# Altium footprint library 6-Connectors-5.PcbLib: 46 footprints (part 4 of 5) (continued)
## TYCO_1-1734282-3 [mm] "Dual Stacked  Plug Over Receptacle Right Angled D-SUB 15 Pins Connector, With Threaded Insert UNC 4-40, And PCB Mount Retention"
height 31.98
pads (32):
  round 5.5 hole 3.2: 16(-16.65,-3.455) 17(16.65,-3.455)
  round 1.7 hole 1: L1(9.695,2.035) L2(6.925,2.035) L3(4.155,2.035) L4(1.385,2.035) L5(-1.385,2.035) L6(-4.155,2.035) L7(-6.925,2.035) L8(-9.695,2.035) L9(8.31,4.875) L10(5.54,4.875) L11(2.77,4.875) L12(0,4.875) L13(-2.77,4.875) L14(-5.54,4.875) L15(-8.31,4.875) U1(-9.695,-4.875) U2(-6.925,-4.875) U3(-4.155,-4.875) U4(-1.385,-4.875) U5(1.385,-4.875) U6(4.155,-4.875) U7(6.925,-4.875) U8(9.695,-4.875) U9(-8.31,-2.035) U10(-5.54,-2.035) U11(-2.77,-2.035) U12(0,-2.035) U13(2.77,-2.035) U14(5.54,-2.035) U15(8.31,-2.035)
Top Overlay:
  lines w0.2: -19.65,12.455 19.65,12.455 ; -19.6,-4.56 -19.6,-6.545 -13.8,-6.545 -13.8,-4.797 ; -19.6,-2.35 -19.6,10.455 ; -19.6,8.285 -13.6,8.285 ; -19.4,8.285 -19.4,7.085 -13.9,7.085 -13.9,8.285 13.9,8.285 13.9,7.085 19.4,7.085 19.4,8.285 ; -13.8,-2.113 -13.8,1.455 -13.6,1.88 ; -13.6,-4.242 -13.6,-6.695 13.6,-6.695 13.6,-4.242 ; -13.6,-2.668 -13.6,10.455 ; -13.087,12.955 -13.087,17.797 cw(c-12.187,17.797) -12.187,18.697 12.187,18.697 cw(c12.187,17.797) 13.087,17.797 13.087,12.955 ; 13.6,-2.668 13.6,10.455 ; 13.6,1.655 13.8,1.455 13.8,-2.113 ; 13.6,8.285 19.6,8.285 ; 13.8,-4.797 13.8,-6.545 19.6,-6.545 19.6,-4.56 ; 19.6,-2.35 19.6,10.451 ; -19.65,10.455 19.65,10.455 19.65,12.955 -19.65,12.955 -19.65,10.455
  text "LOWER" at -2.1,6.26 h1
  text "UPPER" at -2.1,-0.65 h1
  text "9" at 9.881,4.188 h1.5
  text "1" at 11.346,1.273 h1.5
  text "8" at -12.179,1.273 h1.5
  text "15" at -12.041,4.163 h1.5
  text "9" at -11.566,-2.797 h1.5
  text "1" at -11.779,-5.637 h1.5
  text "8" at 10.946,-5.637 h1.5
  text "15" at 9.881,-2.722 h1.5
Mechanical 8:
  lines w0.1: -19.65,12.955 19.65,12.955 ; -17.15,-3.455 -16.65,-3.455 ; -16.65,-3.955 -16.65,-3.455 ; -16.65,-2.955 -16.65,-3.455 ; -16.15,-3.455 -16.65,-3.455 ; -10.195,-4.875 -9.695,-4.875 ; -10.195,2.035 -9.695,2.035 ; -9.695,-5.375 -9.695,-4.875 ; -9.695,-4.375 -9.695,-4.875 ; -9.695,1.535 -9.695,2.035 ; -9.695,2.535 -9.695,2.035 ; -9.195,-4.875 -9.695,-4.875 ; -9.195,2.035 -9.695,2.035 ; -8.81,-2.035 -8.31,-2.035 ; -8.81,4.875 -8.31,4.875 ; -8.31,-2.535 -8.31,-2.035 ; -8.31,-1.535 -8.31,-2.035 ; -8.31,4.375 -8.31,4.875 ; -8.31,5.375 -8.31,4.875 ; -7.81,-2.035 -8.31,-2.035 ; -7.81,4.875 -8.31,4.875 ; -7.425,-4.875 -6.925,-4.875 ; -7.425,2.035 -6.925,2.035 ; -6.925,-5.375 -6.925,-4.875 ; -6.925,-4.375 -6.925,-4.875 ; -6.925,1.535 -6.925,2.035 ; -6.925,2.535 -6.925,2.035 ; -6.425,-4.875 -6.925,-4.875 ; -6.425,2.035 -6.925,2.035 ; -6.04,-2.035 -5.54,-2.035 ; -6.04,4.875 -5.54,4.875 ; -5.54,-2.535 -5.54,-2.035 ; -5.54,-1.535 -5.54,-2.035 ; -5.54,4.375 -5.54,4.875 ; -5.54,5.375 -5.54,4.875 ; -5.04,-2.035 -5.54,-2.035 ; -5.04,4.875 -5.54,4.875 ; -4.655,-4.875 -4.155,-4.875 ; -4.655,2.035 -4.155,2.035 ; -4.155,-5.375 -4.155,-4.875 ; -4.155,-4.375 -4.155,-4.875 ; -4.155,1.535 -4.155,2.035 ; -4.155,2.535 -4.155,2.035 ; -3.655,-4.875 -4.155,-4.875 ; -3.655,2.035 -4.155,2.035 ; -3.27,-2.035 -2.77,-2.035 ; -3.27,4.875 -2.77,4.875 ; -2.77,-2.535 -2.77,-2.035 ; -2.77,-1.535 -2.77,-2.035 ; -2.77,4.375 -2.77,4.875 ; -2.77,5.375 -2.77,4.875 ; -2.27,-2.035 -2.77,-2.035 ; -2.27,4.875 -2.77,4.875 ; -1.885,-4.875 -1.385,-4.875 ; -1.885,2.035 -1.385,2.035 ; -1.385,-5.375 -1.385,-4.875 ; -1.385,-4.375 -1.385,-4.875 ; -1.385,1.535 -1.385,2.035 ; -1.385,2.535 -1.385,2.035 ; -0.885,-4.875 -1.385,-4.875 ; -0.885,2.035 -1.385,2.035 ; -0.5,-2.035 0,-2.035 ; -0.5,0 0,0 ; -0.5,4.875 0,4.875 ; 0,-2.535 0,-2.035 ; 0,-1.535 0,-2.035 ; 0,-0.5 0,0 ; 0,0.5 0,0 ; 0,4.375 0,4.875 ; 0,5.375 0,4.875 ; 0.5,-2.035 0,-2.035 ; 0.5,0 0,0 ; 0.5,4.875 0,4.875 ; 0.885,-4.875 1.385,-4.875 ; 0.885,2.035 1.385,2.035 ; 1.385,-5.375 1.385,-4.875 ; 1.385,-4.375 1.385,-4.875 ; 1.385,1.535 1.385,2.035 ; 1.385,2.535 1.385,2.035 ; 1.885,-4.875 1.385,-4.875 ; 1.885,2.035 1.385,2.035 ; 2.27,-2.035 2.77,-2.035 ; 2.27,4.875 2.77,4.875 ; 2.77,-2.535 2.77,-2.035 ; 2.77,-1.535 2.77,-2.035 ; 2.77,4.375 2.77,4.875 ; 2.77,5.375 2.77,4.875 ; 3.27,-2.035 2.77,-2.035 ; 3.27,4.875 2.77,4.875 ; 3.655,-4.875 4.155,-4.875 ; 3.655,2.035 4.155,2.035 ; 4.155,-5.375 4.155,-4.875 ; 4.155,-4.375 4.155,-4.875 ; 4.155,1.535 4.155,2.035 ; 4.155,2.535 4.155,2.035 ; 4.655,-4.875 4.155,-4.875 ; 4.655,2.035 4.155,2.035 ; 5.04,-2.035 5.54,-2.035 ; 5.04,4.875 5.54,4.875 ; 5.54,-2.535 5.54,-2.035 ; 5.54,-1.535 5.54,-2.035 ; 5.54,4.375 5.54,4.875 ; 5.54,5.375 5.54,4.875 ; 6.04,-2.035 5.54,-2.035 ; 6.04,4.875 5.54,4.875 ; 6.425,-4.875 6.925,-4.875 ; 6.425,2.035 6.925,2.035 ; 6.925,-5.375 6.925,-4.875 ; 6.925,-4.375 6.925,-4.875 ; 6.925,1.535 6.925,2.035 ; 6.925,2.535 6.925,2.035 ; 7.425,-4.875 6.925,-4.875 ; 7.425,2.035 6.925,2.035 ; 7.81,-2.035 8.31,-2.035 ; 7.81,4.875 8.31,4.875 ; 8.31,-2.535 8.31,-2.035 ; 8.31,-1.535 8.31,-2.035 ; 8.31,4.375 8.31,4.875 ; 8.31,5.375 8.31,4.875 ; 8.81,-2.035 8.31,-2.035 ; 8.81,4.875 8.31,4.875 ; 9.195,-4.875 9.695,-4.875 ; 9.195,2.035 9.695,2.035 ; 9.695,-5.375 9.695,-4.875 ; 9.695,-4.375 9.695,-4.875 ; 9.695,1.535 9.695,2.035 ; 9.695,2.535 9.695,2.035 ; 10.195,-4.875 9.695,-4.875 ; 10.195,2.035 9.695,2.035 ; 16.15,-3.455 16.65,-3.455 ; 16.65,-3.955 16.65,-3.455 ; 16.65,-2.955 16.65,-3.455 ; 17.15,-3.455 16.65,-3.455
  text "PCB EDGE" at -3.725,11.475 h1
Mechanical 14:
  circle w0.1: c16.65,-3.455 r1.25
  circle w0.1: c-16.65,-3.455 r1.25
  lines w0.1: -19.65,12.455 19.65,12.455 ; -19.6,8.285 -13.6,8.285 ; -19.6,10.455 -19.6,-6.545 -13.8,-6.545 -13.8,1.455 -13.6,1.88 ; -19.4,8.285 -19.4,7.085 -13.9,7.085 -13.9,8.285 13.9,8.285 13.9,7.085 19.4,7.085 19.4,8.285 ; -17.76,-4.03 -17.3,-4.03 -17.3,-2.88 -17.76,-2.88 ; -17.225,-4.565 -17.225,-4.105 -16.075,-4.105 -16.075,-4.565 ; -17.225,-2.347 -17.225,-2.805 -16.075,-2.805 -16.075,-2.345 ; -15.542,-4.03 -16,-4.03 -16,-2.88 -15.54,-2.88 ; -13.6,10.455 -13.6,-6.695 13.6,-6.695 13.6,10.455 ; -13.087,12.955 -13.087,17.797 cw(c-12.187,17.797) -12.187,18.697 12.187,18.697 cw(c12.187,17.797) 13.087,17.797 13.087,12.955 ; 13.6,1.655 13.8,1.455 13.8,-6.545 19.6,-6.545 19.6,10.451 ; 13.6,8.285 19.6,8.285 ; 15.54,-4.03 16,-4.03 16,-2.88 15.54,-2.88 ; 16.075,-4.565 16.075,-4.105 17.225,-4.105 17.225,-4.565 ; 16.075,-2.347 16.075,-2.805 17.225,-2.805 17.225,-2.345 ; 17.758,-4.03 17.3,-4.03 17.3,-2.88 17.76,-2.88 ; -19.65,10.455 19.65,10.455 19.65,12.955 -19.65,12.955 -19.65,10.455
  text "15" at 9.881,-2.722 h1.5
  text "8" at 10.946,-5.637 h1.5
  text "1" at -11.779,-5.637 h1.5
  text "9" at -11.566,-2.797 h1.5
  text "15" at -12.041,4.163 h1.5
  text "8" at -12.179,1.273 h1.5
  text "1" at 11.346,1.273 h1.5
  text "9" at 9.881,4.188 h1.5
  text "LOWER" at -2.1,6.26 h1
  text "UPPER" at -2.1,-0.65 h1
3D body "TYCO_1-1734282-3.stp": height 31.7, standoff -3.6, extent -19.65,-6.695 19.65,18.755

## TYCO_1-1734285-3 [mm] "Dual Stacked  Right Angled D-SUB 15 Pins Female Connector, With Threaded Insert UNC 4-40, And PCB Mount Retention"
height 31.9
pads (32):
  round 5.5 hole 3.2: 16(-16.65,-3.455) 17(16.65,-3.455)
  round 1.7 hole 1: L1(-9.695,2.035) L2(-6.925,2.035) L3(-4.155,2.035) L4(-1.385,2.035) L5(1.385,2.035) L6(4.155,2.035) L7(6.925,2.035) L8(9.695,2.035) L9(-8.31,4.875) L10(-5.54,4.875) L11(-2.77,4.875) L12(0,4.875) L13(2.77,4.875) L14(5.54,4.875) L15(8.31,4.875) U1(-9.695,-4.875) U2(-6.925,-4.875) U3(-4.155,-4.875) U4(-1.385,-4.875) U5(1.385,-4.875) U6(4.155,-4.875) U7(6.925,-4.875) U8(9.695,-4.875) U9(-8.31,-2.035) U10(-5.54,-2.035) U11(-2.77,-2.035) U12(0,-2.035) U13(2.77,-2.035) U14(5.54,-2.035) U15(8.31,-2.035)
Top Overlay:
  lines w0.2: -19.65,7.355 -12.9,7.355 ; -19.65,10.355 19.65,10.355 ; -19.35,7.355 -19.35,6.691 -13.95,6.691 -13.95,7.355 ; -17.65,10.355 -17.65,12.955 ; -13.2,12.955 ccw(c-13.2,13.855) -12.3,13.855 ; -12.9,-6.545 -19.65,-6.545 -19.65,12.955 19.65,12.955 19.65,-6.545 12.9,-6.545 ; -12.9,10.355 -12.9,-6.695 12.9,-6.695 12.9,10.355 ; -11.3,18.655 -11.3,18.755 11.3,18.755 11.3,18.655 ; -10.8,12.955 -10.8,18.755 ; 10.8,12.955 10.8,18.755 ; 12.9,7.355 19.65,7.355 ; 13.2,12.955 cw(c13.2,13.855) 12.3,13.855 ; 13.95,7.355 13.95,6.691 19.35,6.691 19.35,7.355 ; 17.65,10.355 17.65,12.955 ; -12.3,13.855 12.3,13.855 ; -12.3,13.855 -12.3,17.755 ; -12.3,17.755 cw(c-11.4,17.755) -11.4,18.655 11.399,18.655 cw(c11.4,17.755) 12.3,17.755 ; -12.3,17.755 12.3,17.755 ; 12.3,13.855 12.3,17.755
  text "15" at 9.881,-2.722 h1.5
  text "8" at 10.946,-5.637 h1.5
  text "1" at -11.454,-5.637 h1.5
  text "9" at -11.566,-2.797 h1.5
  text "9" at -11.566,4.113 h1.5
  text "1" at -11.454,1.273 h1.5
  text "8" at 10.946,1.273 h1.5
  text "15" at 9.881,4.188 h1.5
  text "UPPER" at -2.1,-0.65 h1
  text "LOWER" at -2.1,6.26 h1
Mechanical 8:
  lines w0.1: -10.195,-4.875 -9.695,-4.875 ; -10.195,2.035 -9.695,2.035 ; -9.695,-5.375 -9.695,-4.875 ; -9.695,-4.375 -9.695,-4.875 ; -9.695,1.535 -9.695,2.035 ; -9.695,2.535 -9.695,2.035 ; -9.195,-4.875 -9.695,-4.875 ; -9.195,2.035 -9.695,2.035 ; -8.81,-2.035 -8.31,-2.035 ; -8.81,4.875 -8.31,4.875 ; -8.31,-2.535 -8.31,-2.035 ; -8.31,-1.535 -8.31,-2.035 ; -8.31,4.375 -8.31,4.875 ; -8.31,5.375 -8.31,4.875 ; -7.81,-2.035 -8.31,-2.035 ; -7.81,4.875 -8.31,4.875 ; -7.425,-4.875 -6.925,-4.875 ; -7.425,2.035 -6.925,2.035 ; -6.925,-5.375 -6.925,-4.875 ; -6.925,-4.375 -6.925,-4.875 ; -6.925,1.535 -6.925,2.035 ; -6.925,2.535 -6.925,2.035 ; -6.425,-4.875 -6.925,-4.875 ; -6.425,2.035 -6.925,2.035 ; -6.04,-2.035 -5.54,-2.035 ; -6.04,4.875 -5.54,4.875 ; -5.54,-2.535 -5.54,-2.035 ; -5.54,-1.535 -5.54,-2.035 ; -5.54,4.375 -5.54,4.875 ; -5.54,5.375 -5.54,4.875 ; -5.04,-2.035 -5.54,-2.035 ; -5.04,4.875 -5.54,4.875 ; -4.66,-4.875 -4.16,-4.875 ; -4.66,2.035 -4.16,2.035 ; -4.16,-5.375 -4.16,-4.875 ; -4.16,-4.375 -4.16,-4.875 ; -4.16,1.535 -4.16,2.035 ; -4.16,2.535 -4.16,2.035 ; -3.66,-4.875 -4.16,-4.875 ; -3.66,2.035 -4.16,2.035 ; -3.27,-2.035 -2.77,-2.035 ; -3.27,4.875 -2.77,4.875 ; -2.77,-2.535 -2.77,-2.035 ; -2.77,-1.535 -2.77,-2.035 ; -2.77,4.375 -2.77,4.875 ; -2.77,5.375 -2.77,4.875 ; -2.27,-2.035 -2.77,-2.035 ; -2.27,4.875 -2.77,4.875 ; -1.885,-4.875 -1.385,-4.875 ; -1.885,2.035 -1.385,2.035 ; -1.385,-5.375 -1.385,-4.875 ; -1.385,-4.375 -1.385,-4.875 ; -1.385,1.535 -1.385,2.035 ; -1.385,2.535 -1.385,2.035 ; -0.885,-4.875 -1.385,-4.875 ; -0.885,2.035 -1.385,2.035 ; -0.5,-2.035 0,-2.035 ; -0.5,0 0,0 ; -0.5,4.875 0,4.875 ; 0,-2.535 0,-2.035 ; 0,-1.535 0,-2.035 ; 0,-0.5 0,0 ; 0,0.5 0,0 ; 0,4.375 0,4.875 ; 0,5.375 0,4.875 ; 0.5,-2.035 0,-2.035 ; 0.5,0 0,0 ; 0.5,4.875 0,4.875 ; 0.885,-4.875 1.385,-4.875 ; 0.885,2.035 1.385,2.035 ; 1.385,-5.375 1.385,-4.875 ; 1.385,-4.375 1.385,-4.875 ; 1.385,1.535 1.385,2.035 ; 1.385,2.535 1.385,2.035 ; 1.885,-4.875 1.385,-4.875 ; 1.885,2.035 1.385,2.035 ; 2.27,-2.035 2.77,-2.035 ; 2.27,4.875 2.77,4.875 ; 2.77,-2.535 2.77,-2.035 ; 2.77,-1.535 2.77,-2.035 ; 2.77,4.375 2.77,4.875 ; 2.77,5.375 2.77,4.875 ; 3.27,-2.035 2.77,-2.035 ; 3.27,4.875 2.77,4.875 ; 3.655,-4.875 4.155,-4.875 ; 3.655,2.035 4.155,2.035 ; 4.155,-5.375 4.155,-4.875 ; 4.155,-4.375 4.155,-4.875 ; 4.155,1.535 4.155,2.035 ; 4.155,2.535 4.155,2.035 ; 4.655,-4.875 4.155,-4.875 ; 4.655,2.035 4.155,2.035 ; 5.04,-2.035 5.54,-2.035 ; 5.04,4.875 5.54,4.875 ; 5.54,-2.535 5.54,-2.035 ; 5.54,-1.535 5.54,-2.035 ; 5.54,4.375 5.54,4.875 ; 5.54,5.375 5.54,4.875 ; 6.04,-2.035 5.54,-2.035 ; 6.04,4.875 5.54,4.875 ; 6.425,-4.875 6.925,-4.875 ; 6.425,2.035 6.925,2.035 ; 6.925,-5.375 6.925,-4.875 ; 6.925,-4.375 6.925,-4.875 ; 6.925,1.535 6.925,2.035 ; 6.925,2.535 6.925,2.035 ; 7.425,-4.875 6.925,-4.875 ; 7.425,2.035 6.925,2.035 ; 7.81,-2.035 8.31,-2.035 ; 7.81,4.875 8.31,4.875 ; 8.31,-2.535 8.31,-2.035 ; 8.31,-1.535 8.31,-2.035 ; 8.31,4.375 8.31,4.875 ; 8.31,5.375 8.31,4.875 ; 8.81,-2.035 8.31,-2.035 ; 8.81,4.875 8.31,4.875 ; 9.195,-4.875 9.695,-4.875 ; 9.195,2.035 9.695,2.035 ; 9.695,-5.375 9.695,-4.875 ; 9.695,-4.375 9.695,-4.875 ; 9.695,1.535 9.695,2.035 ; 9.695,2.535 9.695,2.035 ; 10.195,-4.875 9.695,-4.875 ; 10.195,2.035 9.695,2.035
Mechanical 14:
  drawing of 6656 lines, arcs and shapes, not listed
  text "UPPER" at -2.1,-0.65 h1
  text "LOWER" at -2.1,6.26 h1
  text "15" at 9.881,4.188 h1.5
  text "8" at 10.946,1.273 h1.5
  text "1" at -11.454,1.273 h1.5
  text "9" at -11.566,4.113 h1.5
  text "9" at -11.566,-2.797 h1.5
  text "1" at -11.454,-5.637 h1.5
  text "8" at 10.946,-5.637 h1.5
  text "15" at 9.881,-2.722 h1.5
3D body "TYCO_1-1734285-3.stp": height 31.6, standoff -3.55, extent -19.65,-6.695 19.65,18.805

## TYCO_1-5748831-1 [mm] "Straight D-SUB 78 Female Contacts, Shell Size 5, With Boardlock and Threaded Insert,(4-40 UNC), HD-22 Serie"
height 12.48
pads (80):
  round 1.7 hole 1: 1(22.914,3.12) 2(20.502,3.12) 3(18.09,3.12) 4(15.678,3.12) 5(13.266,3.12) 6(10.854,3.12) 7(8.442,3.12) 8(6.03,3.12) 9(3.618,3.12) 10(1.206,3.12) 11(-1.206,3.12) 12(-3.618,3.12) 13(-6.03,3.12) 14(-8.442,3.12) 15(-10.854,3.12) 16(-13.266,3.12) 17(-15.678,3.12) 18(-18.09,3.12) 19(-20.502,3.12) 20(-22.914,3.12) 21(21.708,1.04) 22(19.296,1.04) 23(16.884,1.04) 24(14.472,1.04) 25(12.06,1.04) 26(9.648,1.04) 27(7.236,1.04) 28(4.824,1.04) 29(2.412,1.04) 30(0,1.04) 31(-2.412,1.04) 32(-4.824,1.04) 33(-7.236,1.04) 34(-9.648,1.04) 35(-12.06,1.04) 36(-14.472,1.04) 37(-16.884,1.04) 38(-19.296,1.04) 39(-21.708,1.04) 40(22.914,-1.04) 41(20.502,-1.04) 42(18.09,-1.04) 43(15.678,-1.04) 44(13.266,-1.04) 45(10.854,-1.04) 46(8.442,-1.04) 47(6.03,-1.04) 48(3.618,-1.04) 49(1.206,-1.04) 50(-1.206,-1.04) 51(-3.618,-1.04) 52(-6.03,-1.04) 53(-8.442,-1.04) 54(-10.854,-1.04) 55(-13.266,-1.04) 56(-15.678,-1.04) 57(-18.09,-1.04) 58(-20.502,-1.04) 59(-22.914,-1.04) 60(21.708,-3.12) 61(19.296,-3.12) 62(16.884,-3.12) 63(14.472,-3.12) 64(12.06,-3.12) 65(9.648,-3.12) 66(7.236,-3.12) 67(4.824,-3.12) 68(2.412,-3.12) 69(0,-3.12) 70(-2.412,-3.12) 71(-4.824,-3.12) 72(-7.236,-3.12) 73(-9.648,-3.12) 74(-12.06,-3.12) 75(-14.472,-3.12) 76(-16.884,-3.12) 77(-19.296,-3.12) 78(-21.708,-3.12)
  round 5.5 hole 3.1: 79(-30.5,0) 80(30.5,0)
Top Overlay:
  lines w0.2: -33.5,-0.96 -33.5,-6.65 ccw(c-32.5,-6.65) -32.5,-7.65 32.5,-7.65 ccw(c32.5,-6.65) 33.5,-6.65 33.5,-0.96 ; -33.5,0.96 -33.5,6.65 cw(c-32.5,6.65) -32.5,7.65 32.5,7.65 cw(c32.5,6.65) 33.5,6.65 33.5,0.96 ; -26.913,2.402 cw(c-23.052,2.402) -23.052,6.263 23.052,6.263 cw(c23.052,2.402) 26.854,1.732 26.007,-3.072 cw(c22.205,-2.402) 22.205,-6.263 -22.205,-6.263 cw(c-22.205,-2.402) -26.007,-3.072 -26.913,2.402 ; -26.054,1.873 cw(c-23.052,2.402) -23.052,5.45 23.052,5.45 cw(c23.052,2.402) 26.054,1.873 25.219,-2.933 cw(c22.195,-2.376) 22.205,-5.45 -22.205,-5.45 cw(c-22.205,-2.402) -25.207,-2.931 -26.054,1.873 ; -25.758,1.925 cw(c-23.052,2.402) -23.052,5.15 23.052,5.15 cw(c23.052,2.402) 25.758,1.925 24.911,-2.879 cw(c22.205,-2.402) 22.205,-5.15 -22.205,-5.15 cw(c-22.205,-2.402) -24.911,-2.879 -25.758,1.925
  text "20" at -28.929,5.348 h1.5
  text "78" at -28.704,-6.715 h1.5
  text "1" at 27.146,5.263 h1.5
  text "60" at 26.271,-6.927 h1.5
Mechanical 8:
  drawing of 168 lines, arcs and shapes, not listed
Mechanical 14:
  drawing of 196 lines, arcs and shapes, not listed
  text "20" at -28.929,5.348 h1.5
  text "78" at -28.704,-6.715 h1.5
  text "60" at 26.271,-6.927 h1.5
  text "1" at 27.146,5.263 h1.5
3D body "TYCO_1-5748831-1.stp": height 12.1, standoff -3.18, extent -33.5,-7.65 33.5,7.65

## TYCO_2-174225-5 [mm] "68 contacts, AMPLIMITE .050\", Right Angled Header  Series 2 Type B (Threaded  M2.5)"
height 9.5
pads (70):
  round 5.5 hole 2.8: 69(-28.955,-0.953) 70(28.955,-0.953)
  round 1.5 hole 0.9: A1(-20.955,2.858) A2(-19.685,0.953) A3(-18.415,2.858) A4(-17.145,0.953) A5(-15.875,2.858) A6(-14.605,0.953) A7(-13.335,2.858) A8(-12.065,0.952) A9(-10.795,2.858) A10(-9.525,0.953) A11(-8.255,2.858) A12(-6.985,0.953) A13(-5.715,2.858) A14(-4.445,0.953) A15(-3.175,2.858) A16(-1.905,0.953) A17(-0.635,2.858) A18(0.635,0.953) A19(1.905,2.858) A20(3.175,0.953) A21(4.445,2.858) A22(5.715,0.953) A23(6.985,2.858) A24(8.255,0.953) A25(9.525,2.858) A26(10.795,0.953) A27(12.065,2.858) A28(13.335,0.953) A29(14.605,2.858) A30(15.875,0.953) A31(17.145,2.858) A32(18.415,0.953) A33(19.685,2.858) A34(20.955,0.953) B1(-20.955,-0.953) B2(-19.685,-2.858) B3(-18.415,-0.953) B4(-17.145,-2.858) B5(-15.875,-0.953) B6(-14.605,-2.858) B7(-13.335,-0.953) B8(-12.065,-2.858) B9(-10.795,-0.953) B10(-9.525,-2.858) B11(-8.255,-0.953) B12(-6.985,-2.858) B13(-5.715,-0.953) B14(-4.445,-2.858) B15(-3.175,-0.953) B16(-1.905,-2.858) B17(-0.635,-0.953) B18(0.635,-2.858) B19(1.905,-0.953) B20(3.175,-2.858) B21(4.445,-0.953) B22(5.715,-2.858) B23(6.985,-0.953) B24(8.255,-2.858) B25(9.525,-0.953) B26(10.795,-2.858) B27(12.065,-0.953) B28(13.335,-2.858) B29(14.605,-0.953) B30(15.875,-2.858) B31(17.145,-0.953) B32(18.415,-2.858) B33(19.685,-0.953) B34(20.955,-2.858)
Top Overlay:
  circle w0.3: c-20.9,4.75 r0.15
  lines w0.2: -31.955,-6.658 -24.69,-6.658 -24.69,-7.658 -31.955,-7.658 -31.955,2.143 cw(c-29.955,2.143) -29.955,4.143 29.955,4.143 cw(c29.955,2.143) 31.955,2.143 31.955,-7.658 24.69,-7.658 24.69,-6.658 31.955,-6.658 ; -31.955,-4.658 31.955,-4.658 ; -26.055,-7.658 -26.055,-11.658 -26.855,-11.658 -26.855,-11.958 -26.055,-13.158 26.055,-13.158 26.855,-11.958 26.855,-11.658 26.055,-11.658 26.055,-7.658 ; -23.14,-4.658 -23.14,-3.5 ; -23.14,3.5 -23.14,4.143 ; -21.455,-13.158 -21.455,-11.158 cw(c-20.955,-11.158) -20.455,-11.158 -20.455,-13.158 ; -23.14,-7.658 -23.14,-6.658 23.14,-6.658 23.14,-7.658 -23.14,-7.658
  text "B1" at -23.25,-1.5 h1
  text "A2" at -23.25,0.5 h1
  text "A1" at -23.25,2.25 h1
  text "B2" at -23.25,-3.25 h1
  text "A33" at 22,2.335 h1
  text "B34" at 22,-3.365 h1
  text "B33" at 22,-1.415 h1
  text "A34" at 22,0.485 h1
Mechanical 8:
  drawing of 284 lines, arcs and shapes, not listed
Mechanical 14:
  drawing of 176 lines, arcs and shapes, not listed
  text "B1" at -23.25,-1.5 h1.02
  text "A2" at -23.25,0.5 h1.02
  text "A1" at -23.25,2.25 h1.02
  text "B2" at -23.25,-3.25 h1.02
  text "A33" at 22,2.335 h1.02
  text "B34" at 22,-3.365 h1.02
  text "B33" at 22,-1.415 h1.02
  text "A34" at 22,0.485 h1.02
3D body "TYCO_2-174225-5.stp": height 9.5, standoff -2.9, extent -31.955,-13.157 31.955,4.143

## TYCO_2-5174339-5 [mm] "68 contacts,AMPLIMITE .050 Series II Connector, Through-hole Vertical Plug"
height 9.3
pads (70):
  round 5.5 hole 2.8: 69(-28.956,0) 70(28.956,0)
  round 1.5 hole 0.8: A1(-20.955,2.858) A2(-19.685,0.953) A3(-18.415,2.858) A4(-17.145,0.953) A5(-15.875,2.858) A6(-14.605,0.953) A7(-13.335,2.858) A8(-12.065,0.952) A9(-10.795,2.858) A10(-9.525,0.953) A11(-8.255,2.858) A12(-6.985,0.953) A13(-5.715,2.858) A14(-4.445,0.953) A15(-3.175,2.858) A16(-1.905,0.953) A17(-0.635,2.858) A18(0.635,0.953) A19(1.905,2.858) A20(3.175,0.953) A21(4.445,2.858) A22(5.715,0.953) A23(6.985,2.858) A24(8.255,0.953) A25(9.525,2.858) A26(10.795,0.953) A27(12.065,2.858) A28(13.335,0.953) A29(14.605,2.858) A30(15.875,0.953) A31(17.145,2.858) A32(18.415,0.953) A33(19.685,2.858) A34(20.955,0.953) B1(-20.955,-0.953) B2(-19.685,-2.858) B3(-18.415,-0.953) B4(-17.145,-2.858) B5(-15.875,-0.953) B6(-14.605,-2.858) B7(-13.335,-0.953) B8(-12.065,-2.858) B9(-10.795,-0.953) B10(-9.525,-2.858) B11(-8.255,-0.953) B12(-6.985,-2.858) B13(-5.715,-0.953) B14(-4.445,-2.858) B15(-3.175,-0.953) B16(-1.905,-2.858) B17(-0.635,-0.953) B18(0.635,-2.858) B19(1.905,-0.953) B20(3.175,-2.858) B21(4.445,-0.953) B22(5.715,-2.858) B23(6.985,-0.953) B24(8.255,-2.858) B25(9.525,-0.953) B26(10.795,-2.858) B27(12.065,-0.953) B28(13.335,-2.858) B29(14.605,-0.953) B30(15.875,-2.858) B31(17.145,-0.953) B32(18.415,-2.858) B33(19.685,-0.953) B34(20.955,-2.858)
Top Overlay:
  lines w0.2: -26.855,-2.475 -26.855,-3.65 -20.365,-3.65 ; -26.855,2.475 -26.855,3.65 -21.635,3.65 ; -26.325,-1.55 -26.055,-1.55 ; -26.325,1.55 -26.055,1.55 ; -26.055,-3.65 -26.055,-1 ; -26.055,1 -26.055,3.65 ; -22.005,2.85 -22.04,2.85 ccw(c-22.04,1.75) -23.103,1.465 -22.165,-2.035 ccw(c-21.102,-1.75) -21.102,-2.85 -20.735,-2.85 ; 20.365,3.65 26.855,3.65 26.855,2.475 ; 20.735,2.85 22.04,2.85 cw(c22.04,1.75) 23.103,1.465 22.165,-2.035 cw(c21.102,-1.75) 21.932,-2.472 ; 21.644,-3.65 26.855,-3.65 26.855,-2.475 ; 26.055,-3.65 26.055,-1 ; 26.055,-1.55 26.325,-1.55 ; 26.055,1 26.055,3.65 ; 26.055,1.55 26.325,1.55 ; -31.955,-5.15 -31.955,5.15 31.955,5.15 31.955,-5.15 -31.955,-5.15
  text "B1" at -25.22,-1.508 h1
  text "A2" at -25.22,0.492 h1
  text "A1" at -25.22,2.242 h1
  text "B2" at -25.22,-3.258 h1
  text "A33" at 23.24,2.352 h1
  text "B34" at 23.24,-3.348 h1
  text "B33" at 23.24,-1.398 h1
  text "A34" at 23.24,0.502 h1
Mechanical 8:
  drawing of 284 lines, arcs and shapes, not listed
Mechanical 14:
  drawing of 302 lines, arcs and shapes, not listed
  text "B1" at -25.22,-1.508 h1.02
  text "A2" at -25.22,0.492 h1.02
  text "A1" at -25.22,2.242 h1.02
  text "B2" at -25.22,-3.258 h1.02
  text "A33" at 23.24,2.352 h1.02
  text "B34" at 23.24,-3.348 h1.02
  text "B33" at 23.24,-1.398 h1.02
  text "A34" at 23.24,0.502 h1.02
3D body "TYCO_2-5174339-5.stp": height 9.3, standoff -3.1, extent -31.955,-5.15 31.955,5.15

## TYCO_3-1734285-3 [mm] "AMPLIMITE HD-20 - Dual Stacked 37 Pins Right Angled D Subminiature Female Connector"
height 31.98
pads (76):
  round 3.84 hole 3.2: 75(-31.75,-3.455) 76(31.75,-3.455)
  round 1.6 hole 1: L1(-24.93,2.035) L2(-22.16,2.035) L3(-19.39,2.035) L4(-16.62,2.035) L5(-13.85,2.035) L6(-11.08,2.035) L7(-8.31,2.035) L8(-5.54,2.035) L9(-2.77,2.035) L10(0,2.035) L11(2.77,2.035) L12(5.54,2.035) L13(8.31,2.035) L14(11.08,2.035) L15(13.85,2.035) L16(16.62,2.035) L17(19.39,2.035) L18(22.16,2.035) L19(24.93,2.035) L20(-23.545,4.875) L21(-20.775,4.875) L22(-18.005,4.875) L23(-15.235,4.875) L24(-12.465,4.875) L25(-9.695,4.875) L26(-6.925,4.875) L27(-4.155,4.875) L28(-1.385,4.875) L29(1.385,4.875) L30(4.155,4.875) L31(6.925,4.875) L32(9.695,4.875) L33(12.465,4.875) L34(15.235,4.875) L35(18.005,4.875) L36(20.8,4.89) L37(23.545,4.875) U1(-24.93,-4.875) U2(-22.16,-4.875) U3(-19.39,-4.875) U4(-16.62,-4.875) U5(-13.85,-4.875) U6(-11.08,-4.875) U7(-8.31,-4.875) U8(-5.54,-4.875) U9(-2.77,-4.875) U10(0,-4.875) U11(2.77,-4.875) U12(5.54,-4.875) U13(8.31,-4.875) U14(11.08,-4.875) U15(13.85,-4.875) U16(16.62,-4.875) U17(19.39,-4.875) U18(22.16,-4.875) U19(24.93,-4.875) U20(-23.545,-2.035) U21(-20.775,-2.035) U22(-18.005,-2.035) U23(-15.235,-2.035) U24(-12.465,-2.035) U25(-9.695,-2.035) U26(-6.925,-2.035) U27(-4.155,-2.035) U28(-1.385,-2.035) U29(1.385,-2.035) U30(4.155,-2.035) U31(6.925,-2.035) U32(9.695,-2.035) U33(12.465,-2.035) U34(15.235,-2.035) U35(18.005,-2.035) U36(20.775,-2.035) U37(23.545,-2.035)
Top Overlay:
  lines w0.2: -34.67,7.355 -27.92,7.355 ; -34.67,10.355 34.67,10.355 ; -34.45,7.355 -34.45,6.691 -29.05,6.691 -29.05,7.355 ; -32.67,10.355 -32.67,12.955 ; -28.219,12.959 ccw(c-28.3,13.855) -27.4,13.855 ; -27.92,-6.545 -34.67,-6.545 -34.67,12.955 34.67,12.955 34.67,-6.545 27.92,-6.545 ; -27.92,10.355 -27.92,-6.695 27.92,-6.695 27.92,10.355 ; -26.4,18.655 -26.4,18.755 26.4,18.755 26.4,18.655 ; -25.9,12.955 -25.9,18.755 ; 25.9,12.955 25.9,18.755 ; 27.92,7.355 34.67,7.355 ; 28.3,12.955 cw(c28.3,13.855) 27.4,13.855 ; 29.05,7.355 29.05,6.691 34.45,6.691 34.45,7.355 ; 32.67,10.355 32.67,12.955 ; -27.4,13.855 27.4,13.855 ; -27.4,13.855 -27.4,17.755 ; -27.4,17.755 cw(c-26.5,17.755) -26.5,18.655 26.499,18.655 cw(c26.5,17.755) 27.4,17.755 ; -27.4,17.755 27.4,17.755 ; 27.4,13.855 27.4,17.755
  text "LOWER" at -2.275,6.03 h1
  text "UPPER" at -2.275,-1.03 h1
  text "1" at -26.7,1.565 h1
  text "20" at -26.875,4.365 h1
  text "37" at 25.3,4.34 h1
  text "19" at 26,1.44 h1
  text "19" at 26,-5.47 h1
  text "37" at 25.3,-2.57 h1
  text "20" at -26.875,-2.545 h1
  text "1" at -26.7,-5.345 h1
Mechanical 8:
  lines w0.1: -34.67,12.955 34.67,12.955 ; -32.25,-3.455 -31.75,-3.455 ; -31.75,-3.955 -31.75,-3.455 ; -31.75,-2.955 -31.75,-3.455 ; -31.75,4.875 -31.75,18.755 ; -31.25,-3.455 -31.75,-3.455 ; -0.5,0 0,0 ; 0,-0.5 0,0 ; 0,0.5 0,0 ; 0.5,0 0,0 ; 31.25,-3.455 31.75,-3.455 ; 31.75,-3.955 31.75,-3.455 ; 31.75,-2.955 31.75,-3.455 ; 31.75,4.875 31.75,18.755 ; 32.25,-3.455 31.75,-3.455
  text "PCB EDGE" at -6,11.63 h1
Mechanical 14:
  lines w0.1: -34.67,7.355 -27.92,7.355 ; -34.67,10.355 34.67,10.355 ; -34.45,7.355 -34.45,6.691 -29.05,6.691 -29.05,7.355 ; -32.67,10.355 -32.67,12.955 ; -28.219,12.959 ccw(c-28.3,13.855) -27.4,13.855 ; -27.92,-6.545 -34.67,-6.545 -34.67,12.955 34.67,12.955 34.67,-6.545 27.92,-6.545 ; -27.92,10.355 -27.92,-6.695 27.92,-6.695 27.92,10.355 ; -26.4,18.655 -26.4,18.755 26.4,18.755 26.4,18.655 ; -25.9,12.955 -25.9,18.755 ; 25.9,12.955 25.9,18.755 ; 27.92,7.355 34.67,7.355 ; 28.3,12.955 cw(c28.3,13.855) 27.4,13.855 ; 29.05,7.355 29.05,6.691 34.45,6.691 34.45,7.355 ; 32.67,10.355 32.67,12.955 ; -27.4,13.855 27.4,13.855 ; -27.4,13.855 -27.4,17.755 ; -27.4,17.755 cw(c-26.5,17.755) -26.5,18.655 26.499,18.655 cw(c26.5,17.755) 27.4,17.755 ; -27.4,17.755 27.4,17.755 ; 27.4,13.855 27.4,17.755
  text "LOWER" at -2.275,6.03 h1
  text "1" at -26.7,1.565 h1
  text "20" at -26.875,4.365 h1
  text "37" at 25.3,4.34 h1
  text "19" at 26,1.44 h1
  text "UPPER" at -2.275,-1.03 h1
  text "19" at 26,-5.47 h1
  text "37" at 25.3,-2.57 h1
  text "20" at -26.875,-2.545 h1
  text "1" at -26.7,-5.345 h1
3D body "TYCO_3-1734285-3.stp": height 31.6, standoff -3.55, extent -34.67,-6.695 34.67,18.755